# Altium integrated library chipfc_altium_libs.IntLib: 266 symbols (part 2 of 3) (continued)
## ATmega32U4-MU (continued)
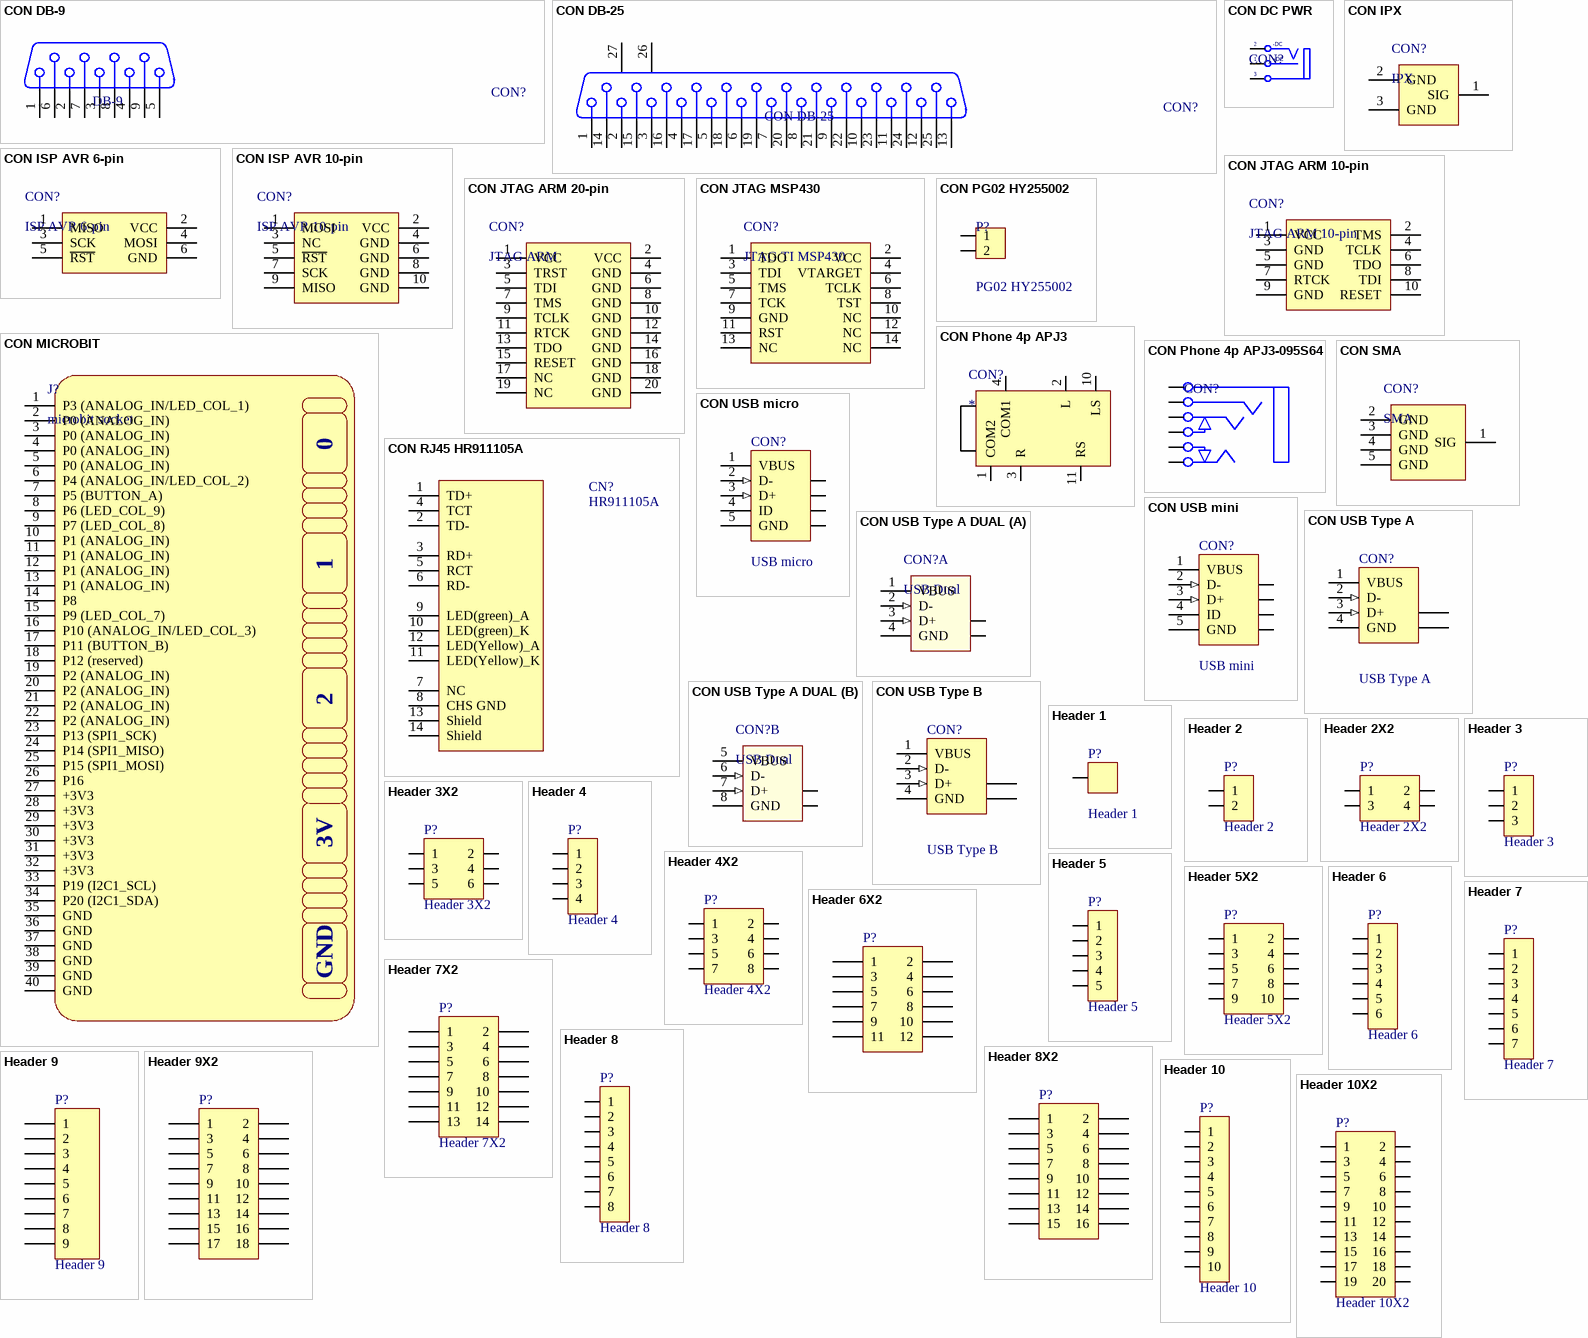
[diagram p9: symbols CON DB-9 to Header 10X2]

## CON DB-9
designator CON?, comment DB-9
Connector D-Sub 9
footprint CONN/DB9/FEMALE
pins: 1, 2, 3, 4, 5, 6, 7, 8, 9

## CON DB-25
designator CON?
Connector D-Sub 25
footprint CONN/DB25/Female (LPT FMALE - D Subminiature; 25 Position; Right Angle; Pitch 1.385 mm)
footprint CONN/DB25/Male (LPT MALE D Subminiature; 25 Position; Right Angle; Pitch 1.385 mm)
pins: 1, 2, 3, 4, 5, 6, 7, 8, 9, 10, 11, 12, 13, 14, 15, 16, 17, 18, 19, 20, 21, 22, 23, 24, 25, 26 MH1, 27 MH2

## CON DC PWR
designator CON?
DC input connector
footprint CONN/DC/PWR/3.5mm
footprint CONN/DC/PWR/5.0MM
pins: 1 S (power) "Sleeve (Ground)", 2 T "Tip Normal (Break Contact)", 3 TN "Tip"
text: -DC; +DC

## CON IPX
designator CON?, comment IPX
footprint CONN/IPX/SMD
pins: 1 SIG, 2 GND, 3 GND

## CON ISP AVR 6-pin
designator CON?, comment ISP AVR 6-pin
ISP AVR 6-pin interface
footprint HDR/Header/6/DL
footprint HDR/Header/6/DL/2mm
footprint HDR/Header/6/DL/BOX
footprint HDR/Header/6/DL/Box/RA
footprint HDR/Header/6/DL/BOX/TR
pins: 1 MISO, 2 VCC, 3 SCK, 4 MOSI, 5 ~{RST}, 6 GND

## CON ISP AVR 10-pin
designator CON?, comment ISP AVR 10-pin
ISP AVR 10-pin interface
footprint HDR/Header/10/DL/BOX (10 pins Male Box Header, IDC Socket)
footprint HDR/Header/10/DL/BOX/RA (10 pins Male Box Header right angle, IDC Socket)
pins: 1 MOSI, 2 VCC, 3 NC, 4 GND, 5 ~{RST}, 6 GND, 7 SCK, 8 GND, 9 MISO, 10 GND

## CON JTAG ARM 10-pin
designator CON?, comment JTAG ARM 10-pin
JTAG ARM 10-pin interface
footprint HDR/Header/10/DL/BOX (10 pins Male Box Header, IDC Socket)
footprint HDR/Header/10/DL/BOX/RA (10 pins Male Box Header right angle, IDC Socket)
pins: 1 VCC, 2 TMS, 3 GND, 4 TCLK, 5 GND, 6 TDO, 7 RTCK, 8 TDI, 9 GND, 10 RESET

## CON JTAG ARM 20-pin
designator CON?, comment JTAG ARM
JTAG ARM 20-pin interface
footprint HDR/Header/20/DL/BOX (20 pins Male Box Header, IDC Socket)
footprint HDR/Header/20/DL/BOX/RA (20 pins Male Box Header, IDC Socket)
pins: 1 VCC, 2 VCC, 3 TRST, 4 GND, 5 TDI, 6 GND, 7 TMS, 8 GND, 9 TCLK, 10 GND, 11 RTCK, 12 GND, 13 TDO, 14 GND, 15 RESET, 16 GND, 17 NC, 18 GND, 19 NC, 20 GND

## CON JTAG MSP430
designator CON?, comment JTAG TI MSP430
JTAG TI 14 pins for DSPs, MSPs
footprint HDR/Header/14/DL/BOX (14 pins Male Box Header, IDC Socket)
pins: 1 TDO, 2 VCC, 3 TDI, 4 VTARGET, 5 TMS, 6 TCLK, 7 TCK, 8 TST, 9 GND, 10 NC, 11 RST, 12 NC, 13 NC, 14 NC

## CON MICROBIT
designator J?, comment microbit socket
microbit socket 40 pins
footprint CONN/MIC127-140-A01
footprint CONN/MIC127-140-001
pins: 1 P3 (ANALOG_IN/LED_COL_1), 2 P0 (ANALOG_IN), 3 P0 (ANALOG_IN), 4 P0 (ANALOG_IN), 5 P0 (ANALOG_IN), 6 P4 (ANALOG_IN/LED_COL_2), 7 P5 (BUTTON_A), 8 P6 (LED_COL_9), 9 P7 (LED_COL_8), 10 P1 (ANALOG_IN), 11 P1 (ANALOG_IN), 12 P1 (ANALOG_IN), 13 P1 (ANALOG_IN), 14 P8, 15 P9 (LED_COL_7), 16 P10 (ANALOG_IN/LED_COL_3), 17 P11 (BUTTON_B), 18 P12 (reserved), 19 P2 (ANALOG_IN), 20 P2 (ANALOG_IN), 21 P2 (ANALOG_IN), 22 P2 (ANALOG_IN), 23 P13 (SPI1_SCK), 24 P14 (SPI1_MISO), 25 P15 (SPI1_MOSI), 26 P16, 27 +3V3, 28 +3V3, 29 +3V3, 30 +3V3, 31 +3V3, 32 +3V3, 33 P19 (I2C1_SCL), 34 P20 (I2C1_SDA), 35 GND, 36 GND, 37 GND, 38 GND, 39 GND, 40 GND
text: 0; 3V

## CON PG02 HY255002
designator P?, comment PG02 HY255002
Pogo 2-pin pitch 3.0 SMD
footprint CONN/HY255002
pins: 1, 2

## CON Phone 4p APJ3
designator CON?
Connector Stereo Phone 4 poles
footprint CONN/Phone/4P/SMD
pins: 1 COM2, 2 L, 3 R, 4 COM1, 10 LS, 11 RS

## CON Phone 4p APJ3-095S64
designator CON?, comment Phone Jack 4-pole APJ3-095S64  (value not drawn)
footprint CONN/Phone/4P/SMD
pins: 1, 2, 3, 4, 10, 11

## CON RJ45 HR911105A
designator CN?, comment HR911105A
Connector RJ45 HR911105A
footprint CONN/RJ45/HR911105A
pins: 1 TD+, 2 TD-, 3 RD+, 4 TCT, 5 RCT, 6 RD-, 7 NC, 8 CHS GND, 9 LED(green)_A, 10 LED(green)_K, 11 LED(Yellow)_K, 12 LED(Yellow)_A, 13 Shield, 14 Shield

## CON SMA
designator CON?, comment SMA
SMA connectors
footprint CONN/SMA (Connector; RF Coaxial, MCX, Thru-Hole; 5 Position; Right Angle)
footprint CONN/SMA/EdgePCB (Connector; RF Coaxial, MCX, Thru-Hole; 5 Position; Right Angle)
footprint CONN/SMA/RA (Connector; RF Coaxial, MCX, Thru-Hole; 5 Position; Right Angle)
pins: 1 SIG, 2 GND, 3 GND, 4 GND, 5 GND

## CON USB micro
designator CON?, comment USB micro
USB micro, 5 pins
footprint CONN/USB/MICRO/RA
footprint CONN/USB/MICRO/RA/H
pins: 1 VBUS (power) "Power", 2 D- (in) "-DATA", 3 D+ (in) "+DATA", 4 ID, 5 GND (power) "Ground", 6 SHLD "Shield", 7 SHLD "Shield", 8 SHLD "Shield", 9 SHLD "Shield"

## CON USB mini
designator CON?, comment USB mini
USB mini type B, 5 pins
footprint CONN/USB/Mini/DIP/RA (Connector; USB2.0, Type B, SM; 5 Position; Right Angle)
footprint CONN/USB/Mini/SMD/RA (Connector; USB2.0, Type B, SM; 5 Position; Right Angle)
pins: 1 VBUS (power) "Power", 2 D- (in) "-DATA", 3 D+ (in) "+DATA", 4 ID, 5 GND (power) "Ground", 6 SHLD "Shield", 7 SHLD "Shield", 8 SHLD "Shield", 9 SHLD "Shield"

## CON USB Type A
designator CON?, comment USB Type A
USB type A, 4 pins
footprint CONN/USB/A/FEMALE/RA
footprint CONN/USB/A/MALE/RA
pins: 1 VBUS (power) "Power", 2 D- (in) "-DATA", 3 D+ (in) "+DATA", 4 GND (power) "Ground", 5 SHLD "Shield", 6 SHLD "Shield"

## CON USB Type A DUAL
designator CON?, comment USB Dual
CONN USB 2.0 R/A DL FMALE TYPE A; PART NO: AU-Y1008-2-R; BRAND: Assmann WSW Components; PACKAGE: CONN USB 2.0 R/A DL FMALE TYPE A; STOCK CODE: AE10334-ND; SUPPLIER: Digi-Key; TYPE: MI
footprint CONN/USB/A/FMALE/DL/RA (USB 2.0 R/A Dual FMALE TYPE A)
part A pins: 1 VBUS, 2 D- (in), 3 D+ (in), 4 GND, 9 SHLD, 10 SHLD
part B pins: 5 VBUS, 6 D- (in), 7 D+ (in), 8 GND, 11 SHLD, 12 SHLD

## CON USB Type B
designator CON?, comment USB Type B
USB type B, 4 pins
footprint CONN/USB/B/RA
pins: 1 VBUS (power) "Power", 2 D- (in) "-DATA", 3 D+ (in) "+DATA", 4 GND (power) "Ground", 5 SHLD "Shield", 6 SHLD "Shield"

## Header 1
designator P?
Header, 1-Pin
footprint HDR/Header/1
footprint HDR/Terminal/1 (Header 1, 1 pin, hight 300mil, Pin to Pin 200, Colour Green)
footprint HDR/Terminal/1/copper/6.0 (Header 1, 1 pin,)
footprint HDR/Terminal/1/copper/9.0 (Header 1, 1 pin,)
footprint HDR/Terminal/1/copper/8.8 (Header 1, 1 pin,)
footprint HDR/Terminal/1/copper/7.5 (Header 1, 1 pin,)
pins: 1

## Header 2
designator P?
Header, 2-Pin
footprint HDR/Header/2
footprint HDR/Header/2/2mm
footprint HDR/Header/2/BOX
footprint HDR/Terminal/2 (Header 2, 2 pin, hight 400mil, Pin to Pin 200mil, Colour Green)
footprint HDR/Terminal/2/4mm
footprint HDR/Terminal/2/5mm (Header 2, 2 pin, hight 400mil, Pin to Pin 200mil, Colour Green)
footprint HDR/Terminal/2/5mm/RA (Header 2, 2 pin, hight 300mil, Pin to Pin 200, Colour Green)
footprint HDR/Terminal/2/9.5MM/ELT950 (ELT950-9.5mm-2P)
footprint HDR/Terminal/2/300
footprint HDR/Terminal/2/400
footprint HDR/Terminal/2/RA (Header 2, 2 pin, hight 300mil, Pin to Pin 200, Colour Green)
footprint HDR/Terminal/2/3.5mm
pins: 1, 2

## Header 2X2
designator P?
Header, 2-Pin, Dual row
footprint HDR/Header/4/DL
pins: 1, 2, 3, 4

## Header 3
designator P?
Header, 3-Pin
footprint HDR/Header/3
footprint HDR/Header/3/2mm
footprint HDR/Header/3/BOX
footprint HDR/Terminal/3
footprint HDR/Terminal/3/4mm
footprint HDR/Terminal/3/400
footprint HDR/Terminal/3/RA (Header 3, 3 pin, hight 300mil, Pin to Pin 200, Colour Green)
pins: 1, 2, 3

## Header 3X2
designator P?
Header, 3-Pin, Dual row
footprint HDR/Header/6/DL
footprint HDR/Header/6/DL/BOX
footprint HDR/Header/6/DL/Box/RA
footprint HDR/Header/6/DL/BOX/TR
footprint HDR/Header/6/DL/2mm
pins: 1, 2, 3, 4, 5, 6

## Header 4
designator P?
Header, 4-Pin
footprint HDR/Header/4
footprint HDR/Header/4/2mm
footprint HDR/Header/4/BOX
footprint HDR/Terminal/4
footprint HDR/Terminal/4/RA (Header 4, 4 pin, hight 300mil, Pin to Pin 200, Colour Green)
footprint HDR/Header/4/BOX/SMD
footprint HDR/Header/4/2mm/BOX/SMD
pins: 1, 2, 3, 4

## Header 4X2
designator P?
Header, 4-Pin, Dual row
footprint HDR/Header/8/DL
footprint HDR/Header/8/DL/SMD
pins: 1, 2, 3, 4, 5, 6, 7, 8

## Header 5
designator P?
Header, 5-Pin
footprint HDR/Header/5
footprint HDR/Header/5/2mm
footprint HDR/Header/5/BOX
footprint HDR/Terminal/5/RA
pins: 1, 2, 3, 4, 5

## Header 5X2
designator P?
Header, 5-Pin, Dual row
footprint HDR/Header/10/DL
footprint HDR/Header/10/DL/BOX (10 pins Male Box Header, IDC Socket)
footprint HDR/Header/10/DL/BOX/RA (10 pins Male Box Header right angle, IDC Socket)
pins: 1, 2, 3, 4, 5, 6, 7, 8, 9, 10

## Header 6
designator P?
Header, 6-Pin
footprint HDR/Header/6
footprint HDR/Header/6/2mm
footprint HDR/Header/6/BOX
footprint HDR/Terminal/6
footprint HDR/TERMINAL/6/375
footprint HDR/Terminal/6/RA (Header 6, 6 pin, hight 300mil, Pin to Pin 200, Colour Green)
pins: 1, 2, 3, 4, 5, 6

## Header 6X2
designator P?
Header, 6-Pin, Dual row
pins: 1, 2, 3, 4, 5, 6, 7, 8, 9, 10, 11, 12

## Header 7
designator P?
Header, 7-Pin
footprint HDR/Header/7
footprint HDR/Header/7/2mm
pins: 1, 2, 3, 4, 5, 6, 7

## Header 7X2
designator P?
Header, 7-Pin, Dual row
footprint HDR/Header/14/DL/BOX (14 pins Male Box Header, IDC Socket)
pins: 1, 2, 3, 4, 5, 6, 7, 8, 9, 10, 11, 12, 13, 14

## Header 8
designator P?
Header, 8-Pin
footprint HDR/Header/8
footprint HDR/Header/8/2mm
footprint HDR/TERMINAL/8/375
pins: 1, 2, 3, 4, 5, 6, 7, 8

## Header 8X2
designator P?
Header, 8-Pin, Dual row
pins: 1, 2, 3, 4, 5, 6, 7, 8, 9, 10, 11, 12, 13, 14, 15, 16

## Header 9
designator P?
Header, 9-Pin
footprint HDR/Header/9
footprint HDR/Header/9/2mm
pins: 1, 2, 3, 4, 5, 6, 7, 8, 9

## Header 9X2
designator P?
Header, 9-Pin, Dual row
pins: 1, 2, 3, 4, 5, 6, 7, 8, 9, 10, 11, 12, 13, 14, 15, 16, 17, 18

## Header 10
designator P?
Header, 10-Pin
footprint HDR/Header/10
footprint HDR/Header/10/2mm
pins: 1, 2, 3, 4, 5, 6, 7, 8, 9, 10

## Header 10X2
designator P?
Header, 10-Pin, Dual row
footprint HDR/Header/20/DL
footprint HDR/Header/20/DL/BOX (20 pins Male Box Header, IDC Socket)
footprint HDR/Header/20/DL/BOX/RA (20 pins Male Box Header, IDC Socket)
pins: 1, 2, 3, 4, 5, 6, 7, 8, 9, 10, 11, 12, 13, 14, 15, 16, 17, 18, 19, 20

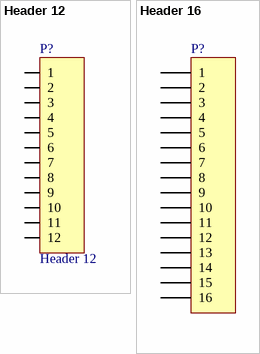
[diagram p10: symbols Header 12 to Header 16]

## Header 12
designator P?
Header, 12-Pin
footprint HDR/Header/12
pins: 1, 2, 3, 4, 5, 6, 7, 8, 9, 10, 11, 12

## Header 16
designator P?
Header, 16-Pin
pins: 1, 2, 3, 4, 5, 6, 7, 8, 9, 10, 11, 12, 13, 14, 15, 16


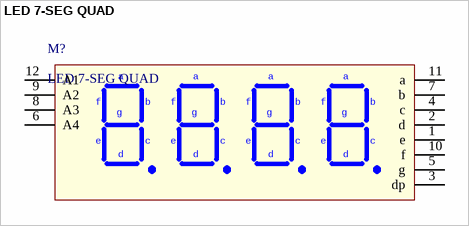
[diagram p11: symbol LED 7-SEG QUAD]

## LED 7-SEG QUAD
designator M?
LED 7-SEG 0.56 QUAD RED
footprint LED/7SEG/0.56/QUAD
pins: 1 e, 2 d, 3 dp, 4 c, 5 g, 6 A4, 7 b, 8 A3, 9 A2, 10 f, 11 a, 12 A1


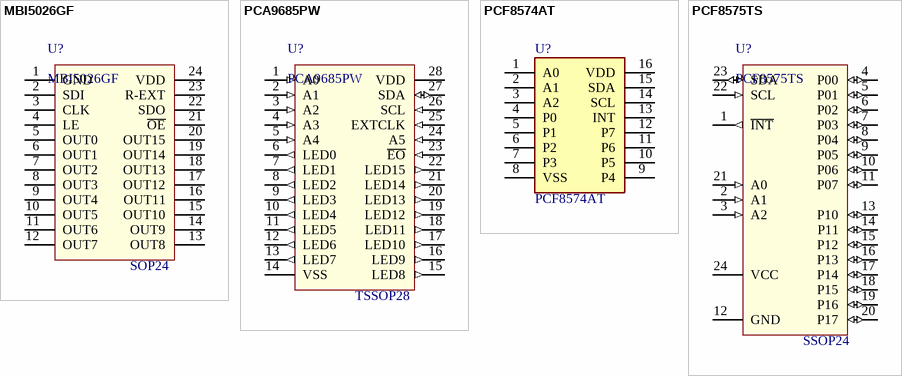
[diagram p12: symbols MBI5026GF to PCF8575TS]

## MBI5026GF
designator U?  PACKAGE: SOP24
16-bit Constant Current LED Sink Driver; BRAND: Macroblock; PART NO: MBI5026GF; TYPE: SMD
footprint SOP24/MBI5026GF
pins: 1 GND "Ground terminal for control logic and current sink", 2 SDI "Serial-data input to the shift register", 3 CLK "Clock input terminal for data shift on rising edge", 4 LE "Data strobe input terminal", 5 OUT0 "Constant current output terminals", 6 OUT1 "Constant current output terminals", 7 OUT2 "Constant current output terminals", 8 OUT3 "Constant current output terminals", 9 OUT4 "Constant current output terminals", 10 OUT5 "Constant current output terminals", 11 OUT6 "Constant current output terminals", 12 OUT7 "Constant current output terminals", 13 OUT8 "Constant current output terminals", 14 OUT9 "Constant current output terminals", 15 OUT10 "Constant current output terminals", 16 OUT11 "Constant current output terminals", 17 OUT12 "Constant current output terminals", 18 OUT13 "Constant current output terminals", 19 OUT14 "Constant current output terminals", 20 OUT15 "Constant current output terminals", 21 ~{OE} "Output enable terminal", 22 SDO "Serial-data output to the following SDI of next driver IC", 23 R-EXT "Input terminal used to connect an external resistor for setting up output current for all output channels", 24 VDD "5V supply voltage terminal"

## PCA9685PW
designator U?  PACKAGE: TSSOP28
16-channel, 12-bit PWM Fm+ I2C-bus LED controller; BRAND: NXP; PART NO: PCA9685PW; TYPE: SMD
footprint TSSOP28/PCA9685PW
pins: 1 A0 (in) "address input 0", 2 A1 (in) "address input 1", 3 A2 (in) "address input 2", 4 A3 (in) "address input 3", 5 A4 (in) "address input 4", 6 LED0 (out) "LED driver 0", 7 LED1 (out) "LED driver 1", 8 LED2 (out) "LED driver 2", 9 LED3 (out) "LED driver 3", 10 LED4 (out) "LED driver 4", 11 LED5 (out) "LED driver 5", 12 LED6 (out) "LED driver 6", 13 LED7 (out) "LED driver 7", 14 VSS (power) "supply ground", 15 LED8 (out) "LED driver 8", 16 LED9 (out) "LED driver 9", 17 LED10 (out) "LED driver 10", 18 LED11 (out) "LED driver 11", 19 LED12 (out) "LED driver 12", 20 LED13 (out) "LED driver 13", 21 LED14 (out) "LED driver 14", 22 LED15 (out) "LED driver 15", 23 ~{EO} (in) "active LOW output enable", 24 A5 (in) "address input 5", 25 EXTCLK (in) "external clock input", 26 SCL (in) "serial clock line", 27 SDA (io) "serial data line", 28 VDD (power) "supply voltage"

## PCF8574AT
designator U?
Remote 8-bit I/O expander for I2C-bus with interrupt; PART NO: PCF8574AT/3; BRAND: NXP; PACKAGE: SO16; TYPE: SMD
footprint SO16/PCF8574AT
pins: 1 A0, 2 A1, 3 A2, 4 P0, 5 P1, 6 P2, 7 P3, 8 VSS, 9 P4, 10 P5, 11 P6, 12 P7, 13 INT, 14 SCL, 15 SDA, 16 VDD

## PCF8575TS
designator U?  PACKAGE: SSOP24
PCF8575 Remote16-BIT I  2C AND SMBus I/O Expander  with Interrupt Output; BRAND: NXP; PART NO: PCF8575TS; TYPE: SMD
footprint SSOP24/PCF8575TS
pins: 1 ~{INT} (out) "Interrupt output. Connect to VCC through a pull-up resistor", 2 A1 (in) "Address input 1. Connect directly to VCC or ground. Pull-up resistors are not", 3 A2 (in) "Address input 2. Connect directly to VCC or ground. Pull-up resistors are not", 4 P00 (io) "P-port input/output. Push-pull design structure", 5 P01 (io) "P-port input/output. Push-pull design structure", 6 P02 (io) "P-port input/output. Push-pull design structure", 7 P03 (io) "P-port input/output. Push-pull design structure", 8 P04 (io) "P-port input/output. Push-pull design structure", 9 P05 (io) "P-port input/output. Push-pull design structure", 10 P06 (io) "P-port input/output. Push-pull design structure", 11 P07 (io) "P-port input/output. Push-pull design structure", 12 GND (power) "Ground", 13 P10 (io) "P-port input/output. Push-pull design structure", 14 P11 (io) "P-port input/output. Push-pull design structure", 15 P12 (io) "P-port input/output. Push-pull design structure", 16 P13 (io) "P-port input/output. Push-pull design structure", 17 P14 (io) "P-port input/output. Push-pull design structure", 18 P15 (io) "P-port input/output. Push-pull design structure", 19 P16 (io) "P-port input/output. Push-pull design structure", 20 P17 (io) "P-port input/output. Push-pull design structure", 21 A0 (in) "Address input 0. Connect directly to VCC or ground. Pull-up resistors are not", 22 SCL (in) "Serial clock line. Connect to VCC through a pull-up resistor", 23 SDA (io) "Serial data line. Connect to VCC through a pull-up resistor.", 24 VCC (power) "Supply voltage"


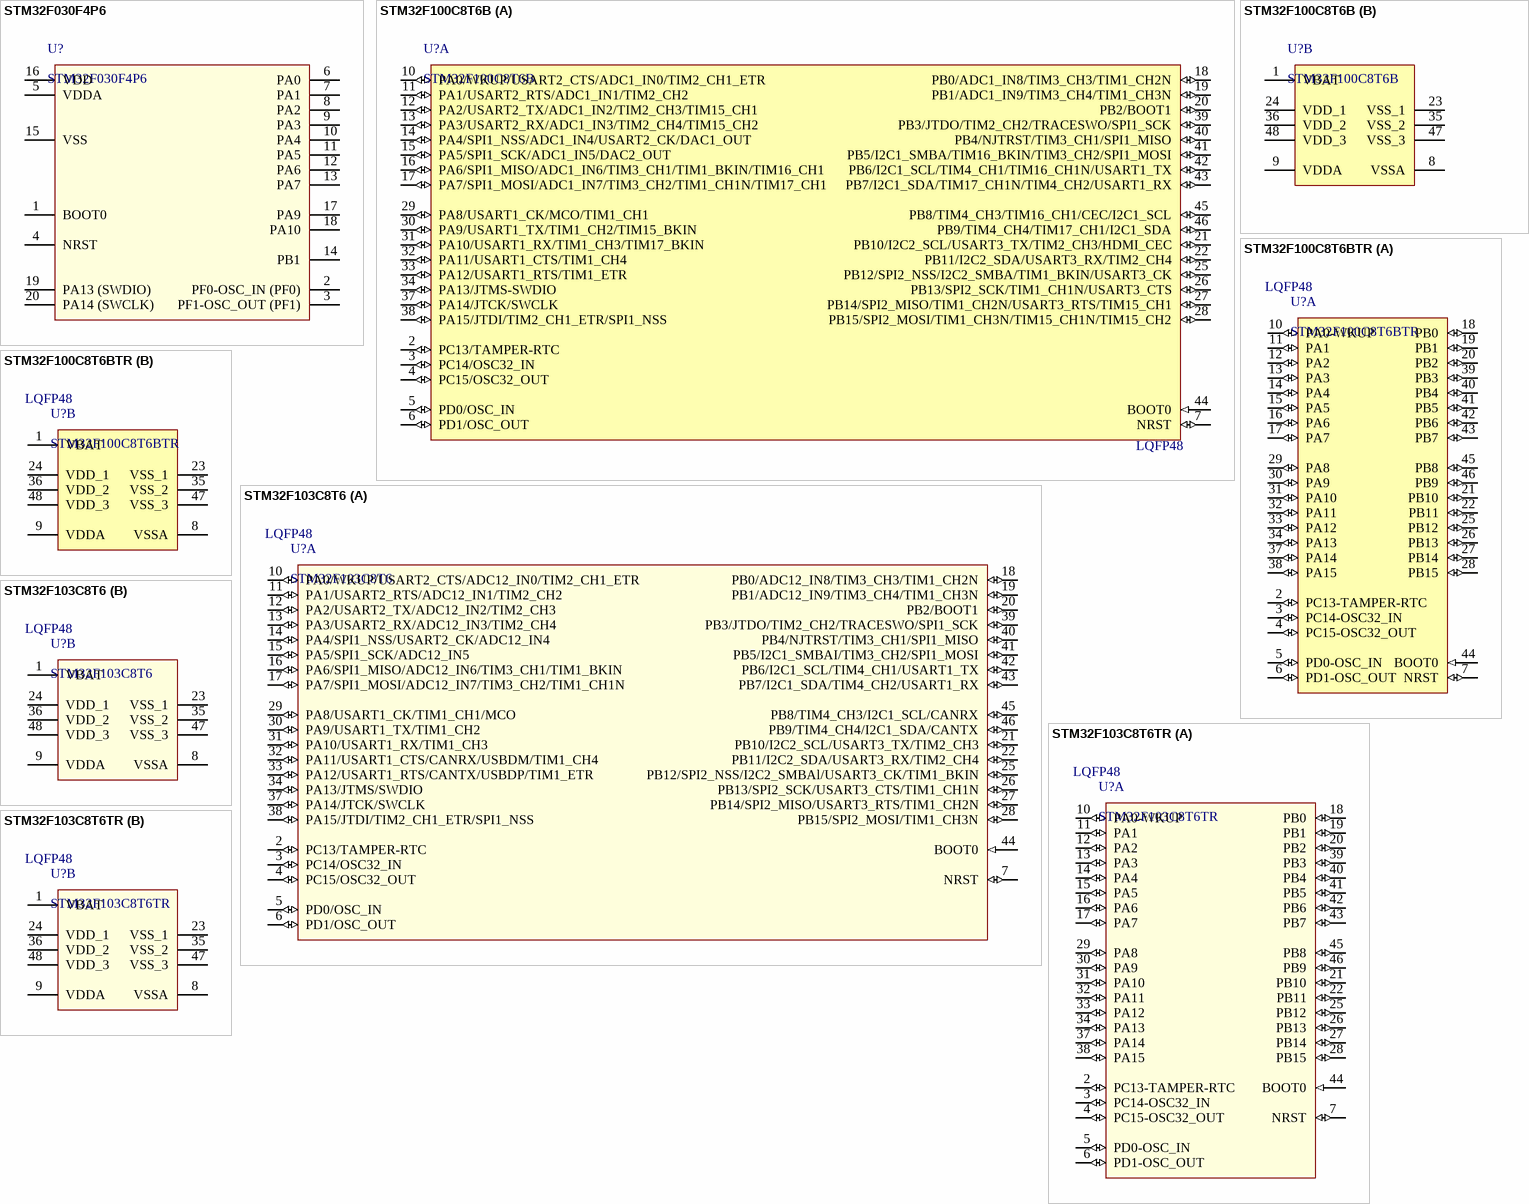
[diagram p13: symbols STM32F030F4P6 to STM32F103C8T6TR]

## STM32F030F4P6
designator U?
IC MCU 32BIT 16KB FLASH 20TSSOP; Manufacturer: STMicroelectronics; Core Processor: ARM® Cortex®-M0; Core Size: 32-Bit; Speed: 48MHz; Connectivity: I²C, SPI, UART/USART; Peripherals: DMA, POR, PWM, WDT; Program Memory Size: 16KB (16K x 8); RAM Size: 4K x 8; Voltage - Supply (Vcc/Vdd): 2.4 V ~ 3.6 V; Data Converters: A/D 11x12b; Oscillator Type: Internal; Supplier 1: Digi-Key; Supplier Part Number 1: 497-14044-5-ND; Manufacturer Part Number: STM32F030F4P6; RoHS: RoHS Compliant; Category: Integrated Circuits (ICs); Stock 1: 8559; Pricing 1: 1=1.3, 74=1.10122, 148=0.90459, 518=0.74728, 1036=0.58995 (USD); Packaging: Tube; Part Status: Active; Program Memory Type: FLASH; EEPROM Size: -; Operating Temperature: -40°C ~ 85°C (TA); Base Part Number: STM32F030; ComponentLink1URL: http://www.st.com/content/ccc/resource/technical/document/datasheet/a4/5d/0b/0e/87/c4/4d/71/DM00088500.pdf/files/DM00088500.pdf/jcr:content/translations/en.DM00088500.pdf; ComponentLink1Description: http://www.st.com/content/ccc/resource/technical/document/datasheet/a4/5d/0b/0e/87/c4/4d/71/DM00088500.pdf/files/DM00088500.pdf/jcr:content/translations/en.DM00088500.pdf; Package: 20-TSSOP (0.173", 4.40mm Width)
footprint ST/TSSOP20
pins: 1 BOOT0, 2 PF0-OSC_IN (PF0), 3 PF1-OSC_OUT (PF1), 4 NRST, 5 VDDA, 6 PA0, 7 PA1, 8 PA2, 9 PA3, 10 PA4, 11 PA5, 12 PA6, 13 PA7, 14 PB1, 15 VSS, 16 VDD, 17 PA9, 18 PA10, 19 PA13 (SWDIO), 20 PA14 (SWCLK)

## STM32F100C8T6B
designator U?  PACKAGE: LQFP48
ARM Cortex-M3 32-bit MCU, 64 KB Flash, 8 KB Internal RAM, 37 I/Os, 48-pin LQFP, -40 to 85 degC, Tray
footprint STM-LQFP48_N (QFP, 48-Leads, Body 7x7mm, Pitch 0.5mm, IPC Medium Density)
footprint STM-LQFP48_L (QFP, 48-Leads, Body 7x7mm, Pitch 0.5mm, IPC High Density)
footprint STM-LQFP48_M (QFP, 48-Leads, Body 7x7mm, Pitch 0.5mm, IPC Low Density)
part A pins: 2 PC13/TAMPER-RTC (io) "PC13-TAMPER-RTC/PC13/TAMPER-RTC", 3 PC14/OSC32_IN (io) "PC14-OSC32_IN/PC14/OSC32_IN", 4 PC15/OSC32_OUT (io) "PC15-OSC32_OUT/PC15/OSC32_OUT", 5 PD0/OSC_IN (io), 6 PD1/OSC_OUT (io), 7 NRST (io), 10 PA0/WKUP/USART2_CTS/ADC1_IN0/TIM2_CH1_ETR (io) "PA0-WKUP/PA0/WKUP/USART2_CTS/ADC1_IN0/TIM2_CH1_ETR", 11 PA1/USART2_RTS/ADC1_IN1/TIM2_CH2 (io), 12 PA2/USART2_TX/ADC1_IN2/TIM2_CH3/TIM15_CH1 (io), 13 PA3/USART2_RX/ADC1_IN3/TIM2_CH4/TIM15_CH2 (io), 14 PA4/SPI1_NSS/ADC1_IN4/USART2_CK/DAC1_OUT (io), 15 PA5/SPI1_SCK/ADC1_IN5/DAC2_OUT (io), 16 PA6/SPI1_MISO/ADC1_IN6/TIM3_CH1/TIM1_BKIN/TIM16_CH1 (io), 17 PA7/SPI1_MOSI/ADC1_IN7/TIM3_CH2/TIM1_CH1N/TIM17_CH1 (io), 18 PB0/ADC1_IN8/TIM3_CH3/TIM1_CH2N (io), 19 PB1/ADC1_IN9/TIM3_CH4/TIM1_CH3N (io), 20 PB2/BOOT1 (io), 21 PB10/I2C2_SCL/USART3_TX/TIM2_CH3/HDMI_CEC (io), 22 PB11/I2C2_SDA/USART3_RX/TIM2_CH4 (io), 25 PB12/SPI2_NSS/I2C2_SMBA/TIM1_BKIN/USART3_CK (io), 26 PB13/SPI2_SCK/TIM1_CH1N/USART3_CTS (io), 27 PB14/SPI2_MISO/TIM1_CH2N/USART3_RTS/TIM15_CH1 (io), 28 PB15/SPI2_MOSI/TIM1_CH3N/TIM15_CH1N/TIM15_CH2 (io), 29 PA8/USART1_CK/MCO/TIM1_CH1 (io), 30 PA9/USART1_TX/TIM1_CH2/TIM15_BKIN (io), 31 PA10/USART1_RX/TIM1_CH3/TIM17_BKIN (io), 32 PA11/USART1_CTS/TIM1_CH4 (io), 33 PA12/USART1_RTS/TIM1_ETR (io), 34 PA13/JTMS-SWDIO (io), 37 PA14/JTCK/SWCLK (io), 38 PA15/JTDI/TIM2_CH1_ETR/SPI1_NSS (io), 39 PB3/JTDO/TIM2_CH2/TRACESWO/SPI1_SCK (io), 40 PB4/NJTRST/TIM3_CH1/SPI1_MISO (io), 41 PB5/I2C1_SMBA/TIM16_BKIN/TIM3_CH2/SPI1_MOSI (io), 42 PB6/I2C1_SCL/TIM4_CH1/TIM16_CH1N/USART1_TX (io), 43 PB7/I2C1_SDA/TIM17_CH1N/TIM4_CH2/USART1_RX (io), 44 BOOT0 (in), 45 PB8/TIM4_CH3/TIM16_CH1/CEC/I2C1_SCL (io), 46 PB9/TIM4_CH4/TIM17_CH1/I2C1_SDA (io)
part B pins: 1 VBAT (power), 8 VSSA (power), 9 VDDA (power), 23 VSS_1 (power), 24 VDD_1 (power), 35 VSS_2 (power), 36 VDD_2 (power), 47 VSS_3 (power), 48 VDD_3 (power)

## STM32F100C8T6BTR
designator U?  PACKAGE: LQFP48
ARM Cortex-M3 32-bit MCU, 64 KB Flash, 8 KB Internal RAM, 37 I/Os, 48-pin LQFP, -40 to 85 degC, Tape and Reel
footprint STM-LQFP48_N (QFP, 48-Leads, Body 7x7mm, Pitch 0.5mm, IPC Medium Density)
footprint STM-LQFP48_L (QFP, 48-Leads, Body 7x7mm, Pitch 0.5mm, IPC High Density)
footprint STM-LQFP48_M (QFP, 48-Leads, Body 7x7mm, Pitch 0.5mm, IPC Low Density)
part A pins: 2 PC13-TAMPER-RTC (io) "PC13-TAMPER-RTC/PC13/TAMPER-RTC", 3 PC14-OSC32_IN (io) "PC14-OSC32_IN/PC14/OSC32_IN", 4 PC15-OSC32_OUT (io) "PC15-OSC32_OUT/PC15/OSC32_OUT", 5 PD0-OSC_IN (io) "PD0/OSC_IN", 6 PD1-OSC_OUT (io) "PD1/OSC_OUT", 7 NRST (io), 10 PA0-WKUP (io) "PA0-WKUP/PA0/WKUP/USART2_CTS/ADC1_IN0/TIM2_CH1_ETR", 11 PA1 (io) "PA1/USART2_RTS/ADC1_IN1/TIM2_CH2", 12 PA2 (io) "PA2/USART2_TX/ADC1_IN2/TIM2_CH3/TIM15_CH1", 13 PA3 (io) "PA3/USART2_RX/ADC1_IN3/TIM2_CH4/TIM15_CH2", 14 PA4 (io) "PA4/SPI1_NSS/ADC1_IN4/USART2_CK/DAC1_OUT", 15 PA5 (io) "PA5/SPI1_SCK/ADC1_IN5/DAC2_OUT", 16 PA6 (io) "PA6/SPI1_MISO/ADC1_IN6/TIM3_CH1/TIM1_BKIN/TIM16_CH1", 17 PA7 (io) "PA7/SPI1_MOSI/ADC1_IN7/TIM3_CH2/TIM1_CH1N/TIM17_CH1", 18 PB0 (io) "PB0/ADC1_IN8/TIM3_CH3/TIM1_CH2N", 19 PB1 (io) "PB1/ADC1_IN9/TIM3_CH4/TIM1_CH3N", 20 PB2 (io) "PB2/BOOT1", 21 PB10 (io) "PB10/I2C2_SCL/USART3_TX/TIM2_CH3/HDMI_CEC", 22 PB11 (io) "PB11/I2C2_SDA/USART3_RX/TIM2_CH4", 25 PB12 (io) "PB12/SPI2_NSS/I2C2_SMBA/TIM1_BKIN/USART3_CK", 26 PB13 (io) "PB13/SPI2_SCK/TIM1_CH1N/USART3_CTS", 27 PB14 (io) "PB14/SPI2_MISO/TIM1_CH2N/USART3_RTS/TIM15_CH1", 28 PB15 (io) "PB15/SPI2_MOSI/TIM1_CH3N/TIM15_CH1N/TIM15_CH2", 29 PA8 (io) "PA8/USART1_CK/MCO/TIM1_CH1", 30 PA9 (io) "PA9/USART1_TX/TIM1_CH2/TIM15_BKIN", 31 PA10 (io) "PA10/USART1_RX/TIM1_CH3/TIM17_BKIN", 32 PA11 (io) "PA11/USART1_CTS/TIM1_CH4", 33 PA12 (io) "PA12/USART1_RTS/TIM1_ETR", 34 PA13 (io) "PA13/JTMS-SWDIO", 37 PA14 (io) "PA14/JTCK/SWCLK", 38 PA15 (io) "PA15/JTDI/TIM2_CH1_ETR/SPI1_NSS", 39 PB3 (io) "PB3/JTDO/TIM2_CH2/TRACESWO/SPI1_SCK", 40 PB4 (io) "PB4/NJTRST/TIM3_CH1/SPI1_MISO", 41 PB5 (io) "PB5/I2C1_SMBA/TIM16_BKIN/TIM3_CH2/SPI1_MOSI", 42 PB6 (io) "PB6/I2C1_SCL/TIM4_CH1/TIM16_CH1N/USART1_TX", 43 PB7 (io) "PB7/I2C1_SDA/TIM17_CH1N/TIM4_CH2/USART1_RX", 44 BOOT0 (in), 45 PB8 (io) "PB8/TIM4_CH3/TIM16_CH1/CEC/I2C1_SCL", 46 PB9 (io) "PB9/TIM4_CH4/TIM17_CH1/I2C1_SDA"
part B pins: 1 VBAT (power), 8 VSSA (power), 9 VDDA (power), 23 VSS_1 (power), 24 VDD_1 (power), 35 VSS_2 (power), 36 VDD_2 (power), 47 VSS_3 (power), 48 VDD_3 (power)

## STM32F103C8T6
designator U?  PACKAGE: LQFP48
ARM Cortex-M3 32-bit MCU, 64 KB Flash, 20 KB Internal RAM, 37 I/Os, 48-pin LQFP, -40 to 85 degC, Tray
footprint STM-LQFP48_N (QFP, 48-Leads, Body 7x7mm, Pitch 0.5mm, IPC Medium Density)
footprint STM-LQFP48_L (QFP, 48-Leads, Body 7x7mm, Pitch 0.5mm, IPC High Density)
footprint STM-LQFP48_M (QFP, 48-Leads, Body 7x7mm, Pitch 0.5mm, IPC Low Density)
part A pins: 2 PC13/TAMPER-RTC (io) "PC13-TAMPER-RTC/PC13/TAMPER-RTC", 3 PC14/OSC32_IN (io) "PC14-OSC32_IN/PC14/OSC32_IN", 4 PC15/OSC32_OUT (io) "PC15-OSC32_OUT/PC15/OSC32_OUT", 5 PD0/OSC_IN (io), 6 PD1/OSC_OUT (io), 7 NRST (io), 10 PA0/WKUP/USART2_CTS/ADC12_IN0/TIM2_CH1_ETR (io) "PA0-WKUP/PA0/WKUP/USART2_CTS/ADC12_IN0/TIM2_CH1_ETR", 11 PA1/USART2_RTS/ADC12_IN1/TIM2_CH2 (io), 12 PA2/USART2_TX/ADC12_IN2/TIM2_CH3 (io), 13 PA3/USART2_RX/ADC12_IN3/TIM2_CH4 (io), 14 PA4/SPI1_NSS/USART2_CK/ADC12_IN4 (io), 15 PA5/SPI1_SCK/ADC12_IN5 (io), 16 PA6/SPI1_MISO/ADC12_IN6/TIM3_CH1/TIM1_BKIN (io), 17 PA7/SPI1_MOSI/ADC12_IN7/TIM3_CH2/TIM1_CH1N (io), 18 PB0/ADC12_IN8/TIM3_CH3/TIM1_CH2N (io), 19 PB1/ADC12_IN9/TIM3_CH4/TIM1_CH3N (io), 20 PB2/BOOT1 (io), 21 PB10/I2C2_SCL/USART3_TX/TIM2_CH3 (io), 22 PB11/I2C2_SDA/USART3_RX/TIM2_CH4 (io), 25 PB12/SPI2_NSS/I2C2_SMBAl/USART3_CK/TIM1_BKIN (io), 26 PB13/SPI2_SCK/USART3_CTS/TIM1_CH1N (io), 27 PB14/SPI2_MISO/USART3_RTS/TIM1_CH2N (io), 28 PB15/SPI2_MOSI/TIM1_CH3N (io), 29 PA8/USART1_CK/TIM1_CH1/MCO (io), 30 PA9/USART1_TX/TIM1_CH2 (io), 31 PA10/USART1_RX/TIM1_CH3 (io), 32 PA11/USART1_CTS/CANRX/USBDM/TIM1_CH4 (io), 33 PA12/USART1_RTS/CANTX/USBDP/TIM1_ETR (io), 34 PA13/JTMS/SWDIO (io), 37 PA14/JTCK/SWCLK (io), 38 PA15/JTDI/TIM2_CH1_ETR/SPI1_NSS (io), 39 PB3/JTDO/TIM2_CH2/TRACESWO/SPI1_SCK (io), 40 PB4/NJTRST/TIM3_CH1/SPI1_MISO (io), 41 PB5/I2C1_SMBAI/TIM3_CH2/SPI1_MOSI (io), 42 PB6/I2C1_SCL/TIM4_CH1/USART1_TX (io), 43 PB7/I2C1_SDA/TIM4_CH2/USART1_RX (io), 44 BOOT0 (in), 45 PB8/TIM4_CH3/I2C1_SCL/CANRX (io), 46 PB9/TIM4_CH4/I2C1_SDA/CANTX (io)
part B pins: 1 VBAT (power), 8 VSSA (power), 9 VDDA (power), 23 VSS_1 (power), 24 VDD_1 (power), 35 VSS_2 (power), 36 VDD_2 (power), 47 VSS_3 (power), 48 VDD_3 (power)

## STM32F103C8T6TR
designator U?  PACKAGE: LQFP48
ARM Cortex-M3 32-bit MCU, 64 KB Flash, 20 KB Internal RAM, 37 I/Os, 48-pin LQFP, -40 to 85 degC, Tape and Reel
footprint STM-LQFP48_N (QFP, 48-Leads, Body 7x7mm, Pitch 0.5mm, IPC Medium Density)
footprint STM-LQFP48_L (QFP, 48-Leads, Body 7x7mm, Pitch 0.5mm, IPC High Density)
footprint STM-LQFP48_M (QFP, 48-Leads, Body 7x7mm, Pitch 0.5mm, IPC Low Density)
part A pins: 2 PC13-TAMPER-RTC (io) "PC13-TAMPER-RTC/PC13/TAMPER-RTC", 3 PC14-OSC32_IN (io) "PC14-OSC32_IN/PC14/OSC32_IN", 4 PC15-OSC32_OUT (io) "PC15-OSC32_OUT/PC15/OSC32_OUT", 5 PD0-OSC_IN (io) "PD0/OSC_IN", 6 PD1-OSC_OUT (io) "PD1/OSC_OUT", 7 NRST (io), 10 PA0-WKUP (io) "PA0-WKUP/PA0/WKUP/USART2_CTS/ADC12_IN0/TIM2_CH1_ETR", 11 PA1 (io) "PA1/USART2_RTS/ADC12_IN1/TIM2_CH2", 12 PA2 (io) "PA2/USART2_TX/ADC12_IN2/TIM2_CH3", 13 PA3 (io) "PA3/USART2_RX/ADC12_IN3/TIM2_CH4", 14 PA4 (io) "PA4/SPI1_NSS/USART2_CK/ADC12_IN4", 15 PA5 (io) "PA5/SPI1_SCK/ADC12_IN5", 16 PA6 (io) "PA6/SPI1_MISO/ADC12_IN6/TIM3_CH1/TIM1_BKIN", 17 PA7 (io) "PA7/SPI1_MOSI/ADC12_IN7/TIM3_CH2/TIM1_CH1N", 18 PB0 (io) "PB0/ADC12_IN8/TIM3_CH3/TIM1_CH2N", 19 PB1 (io) "PB1/ADC12_IN9/TIM3_CH4/TIM1_CH3N", 20 PB2 (io) "PB2/BOOT1", 21 PB10 (io) "PB10/I2C2_SCL/USART3_TX/TIM2_CH3", 22 PB11 (io) "PB11/I2C2_SDA/USART3_RX/TIM2_CH4", 25 PB12 (io) "PB12/SPI2_NSS/I2C2_SMBAl/USART3_CK/TIM1_BKIN", 26 PB13 (io) "PB13/SPI2_SCK/USART3_CTS/TIM1_CH1N", 27 PB14 (io) "PB14/SPI2_MISO/USART3_RTS/TIM1_CH2N", 28 PB15 (io) "PB15/SPI2_MOSI/TIM1_CH3N", 29 PA8 (io) "PA8/USART1_CK/TIM1_CH1/MCO", 30 PA9 (io) "PA9/USART1_TX/TIM1_CH2", 31 PA10 (io) "PA10/USART1_RX/TIM1_CH3", 32 PA11 (io) "PA11/USART1_CTS/CANRX/USBDM/TIM1_CH4", 33 PA12 (io) "PA12/USART1_RTS/CANTX/USBDP/TIM1_ETR", 34 PA13 (io) "PA13/JTMS/SWDIO", 37 PA14 (io) "PA14/JTCK/SWCLK", 38 PA15 (io) "PA15/JTDI/TIM2_CH1_ETR/SPI1_NSS", 39 PB3 (io) "PB3/JTDO/TIM2_CH2/TRACESWO/SPI1_SCK", 40 PB4 (io) "PB4/NJTRST/TIM3_CH1/SPI1_MISO", 41 PB5 (io) "PB5/I2C1_SMBAI/TIM3_CH2/SPI1_MOSI", 42 PB6 (io) "PB6/I2C1_SCL/TIM4_CH1/USART1_TX", 43 PB7 (io) "PB7/I2C1_SDA/TIM4_CH2/USART1_RX", 44 BOOT0 (in), 45 PB8 (io) "PB8/TIM4_CH3/I2C1_SCL/CANRX", 46 PB9 (io) "PB9/TIM4_CH4/I2C1_SDA/CANTX"
part B pins: 1 VBAT (power), 8 VSSA (power), 9 VDDA (power), 23 VSS_1 (power), 24 VDD_1 (power), 35 VSS_2 (power), 36 VDD_2 (power), 47 VSS_3 (power), 48 VDD_3 (power)


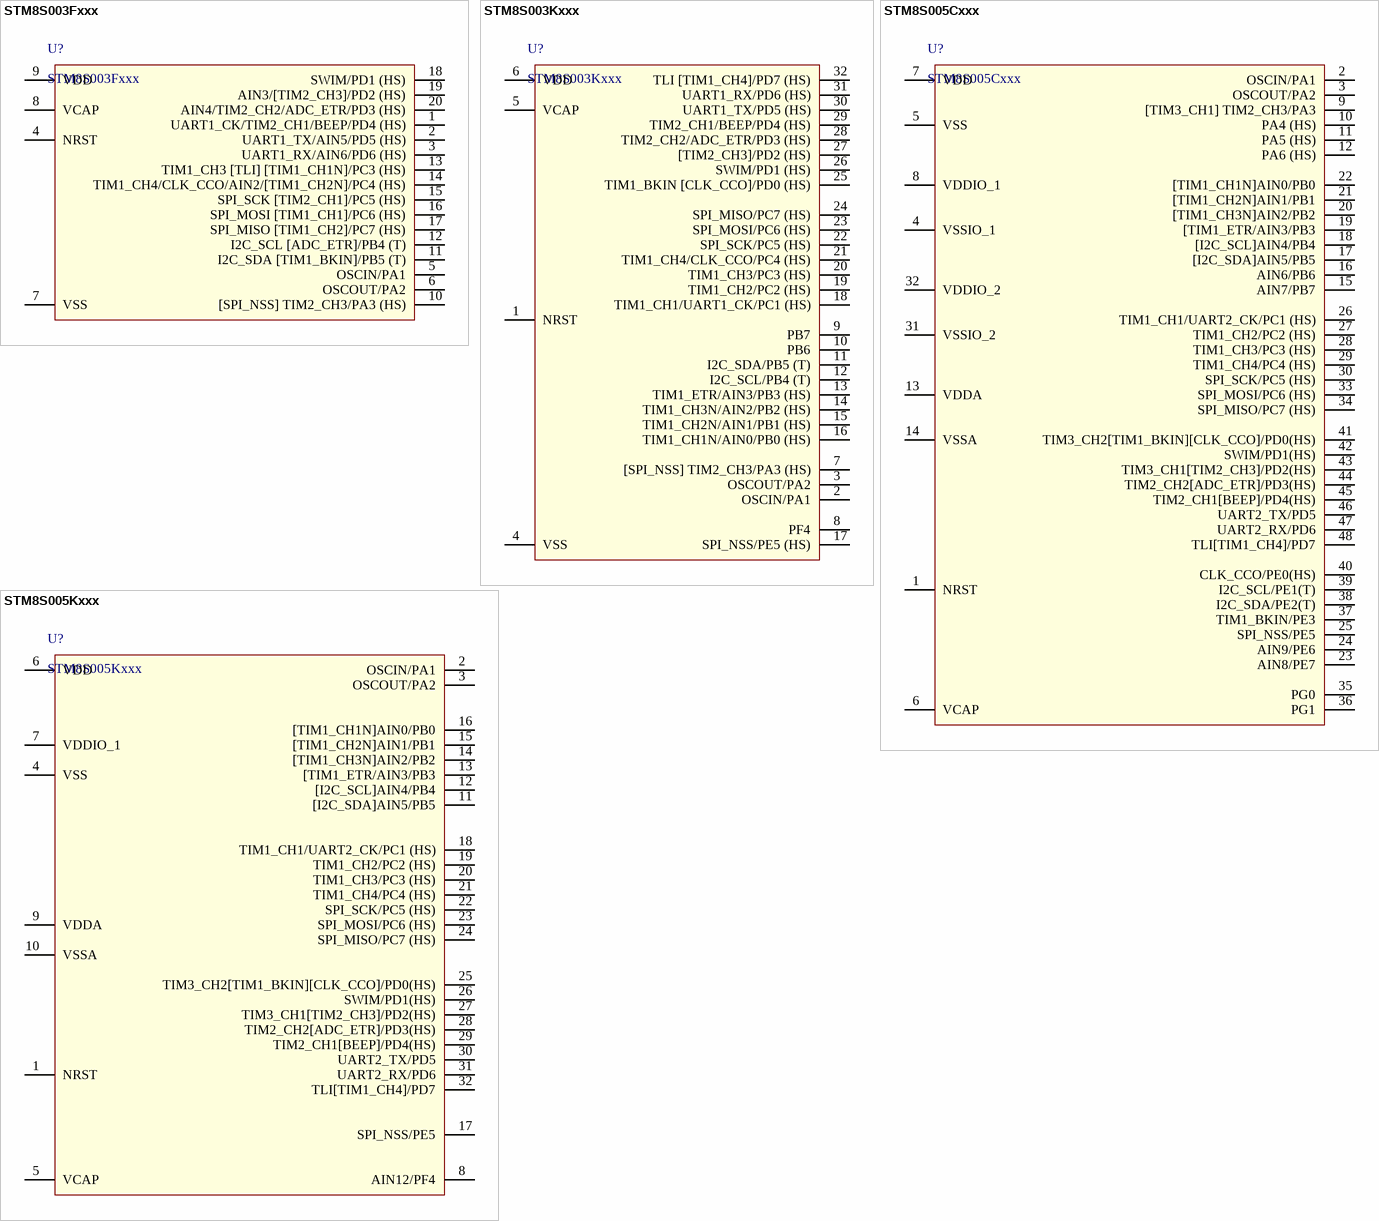
[diagram p14: symbols STM8S003Fxxx to STM8S005Kxxx]

## STM8S003Fxxx
designator U?
Value line, 16 MHz STM8S 8-bit MCU, 8 Kbytes Flash, 128 bytes data EEPROM, 10-bit ADC, 3 timers, UART, SPI, I²C
footprint ST/TSSOP20
pins: 1 UART1_CK/TIM2_CH1/BEEP/PD4 (HS), 2 UART1_TX/AIN5/PD5 (HS), 3 UART1_RX/AIN6/PD6 (HS), 4 NRST, 5 OSCIN/PA1, 6 OSCOUT/PA2, 7 VSS, 8 VCAP, 9 VDD, 10 [SPI_NSS] TIM2_CH3/PA3 (HS), 11 I2C_SDA [TIM1_BKIN]/PB5 (T), 12 I2C_SCL [ADC_ETR]/PB4 (T), 13 TIM1_CH3 [TLI] [TIM1_CH1N]/PC3 (HS), 14 TIM1_CH4/CLK_CCO/AIN2/[TIM1_CH2N]/PC4 (HS), 15 SPI_SCK [TIM2_CH1]/PC5 (HS), 16 SPI_MOSI [TIM1_CH1]/PC6 (HS), 17 SPI_MISO [TIM1_CH2]/PC7 (HS), 18 SWIM/PD1 (HS), 19 AIN3/[TIM2_CH3]/PD2 (HS), 20 AIN4/TIM2_CH2/ADC_ETR/PD3 (HS)

## STM8S003Kxxx
designator U?
Value line, 16 MHz STM8S 8-bit MCU, 8 Kbytes Flash, 128 bytes data EEPROM, 10-bit ADC, 3 timers, UART, SPI, I²C
footprint ST/QFP/80P/32 (TQFP, 32-Leads, Body 9.0x9.0mm (max), Pitch 0.80mm, IPC Medium Density)
pins: 1 NRST, 2 OSCIN/PA1, 3 OSCOUT/PA2, 4 VSS, 5 VCAP, 6 VDD, 7 [SPI_NSS] TIM2_CH3/PA3 (HS), 8 PF4, 9 PB7, 10 PB6, 11 I2C_SDA/PB5 (T), 12 I2C_SCL/PB4 (T), 13 TIM1_ETR/AIN3/PB3 (HS), 14 TIM1_CH3N/AIN2/PB2 (HS), 15 TIM1_CH2N/AIN1/PB1 (HS), 16 TIM1_CH1N/AIN0/PB0 (HS), 17 SPI_NSS/PE5 (HS), 18 TIM1_CH1/UART1_CK/PC1 (HS), 19 TIM1_CH2/PC2 (HS), 20 TIM1_CH3/PC3 (HS), 21 TIM1_CH4/CLK_CCO/PC4 (HS), 22 SPI_SCK/PC5 (HS), 23 SPI_MOSI/PC6 (HS), 24 SPI_MISO/PC7 (HS), 25 TIM1_BKIN [CLK_CCO]/PD0 (HS), 26 SWIM/PD1 (HS), 27 [TIM2_CH3]/PD2 (HS), 28 TIM2_CH2/ADC_ETR/PD3 (HS), 29 TIM2_CH1/BEEP/PD4 (HS), 30 UART1_TX/PD5 (HS), 31 UART1_RX/PD6 (HS), 32 TLI [TIM1_CH4]/PD7 (HS)